# Altium footprint library IMR_Lib.PcbLib: 58 footprints (part 2 of 4)
Each footprint in its own frame and in the unit in brackets; x right, y up, seen from the top. Pads: shape width x height; smd on the part's side, far side on the other; paste and mask are expansions set on the pad; w line width, h text height; cw(c..) or ccw(c..) is an arc to the next point about the centre after c.
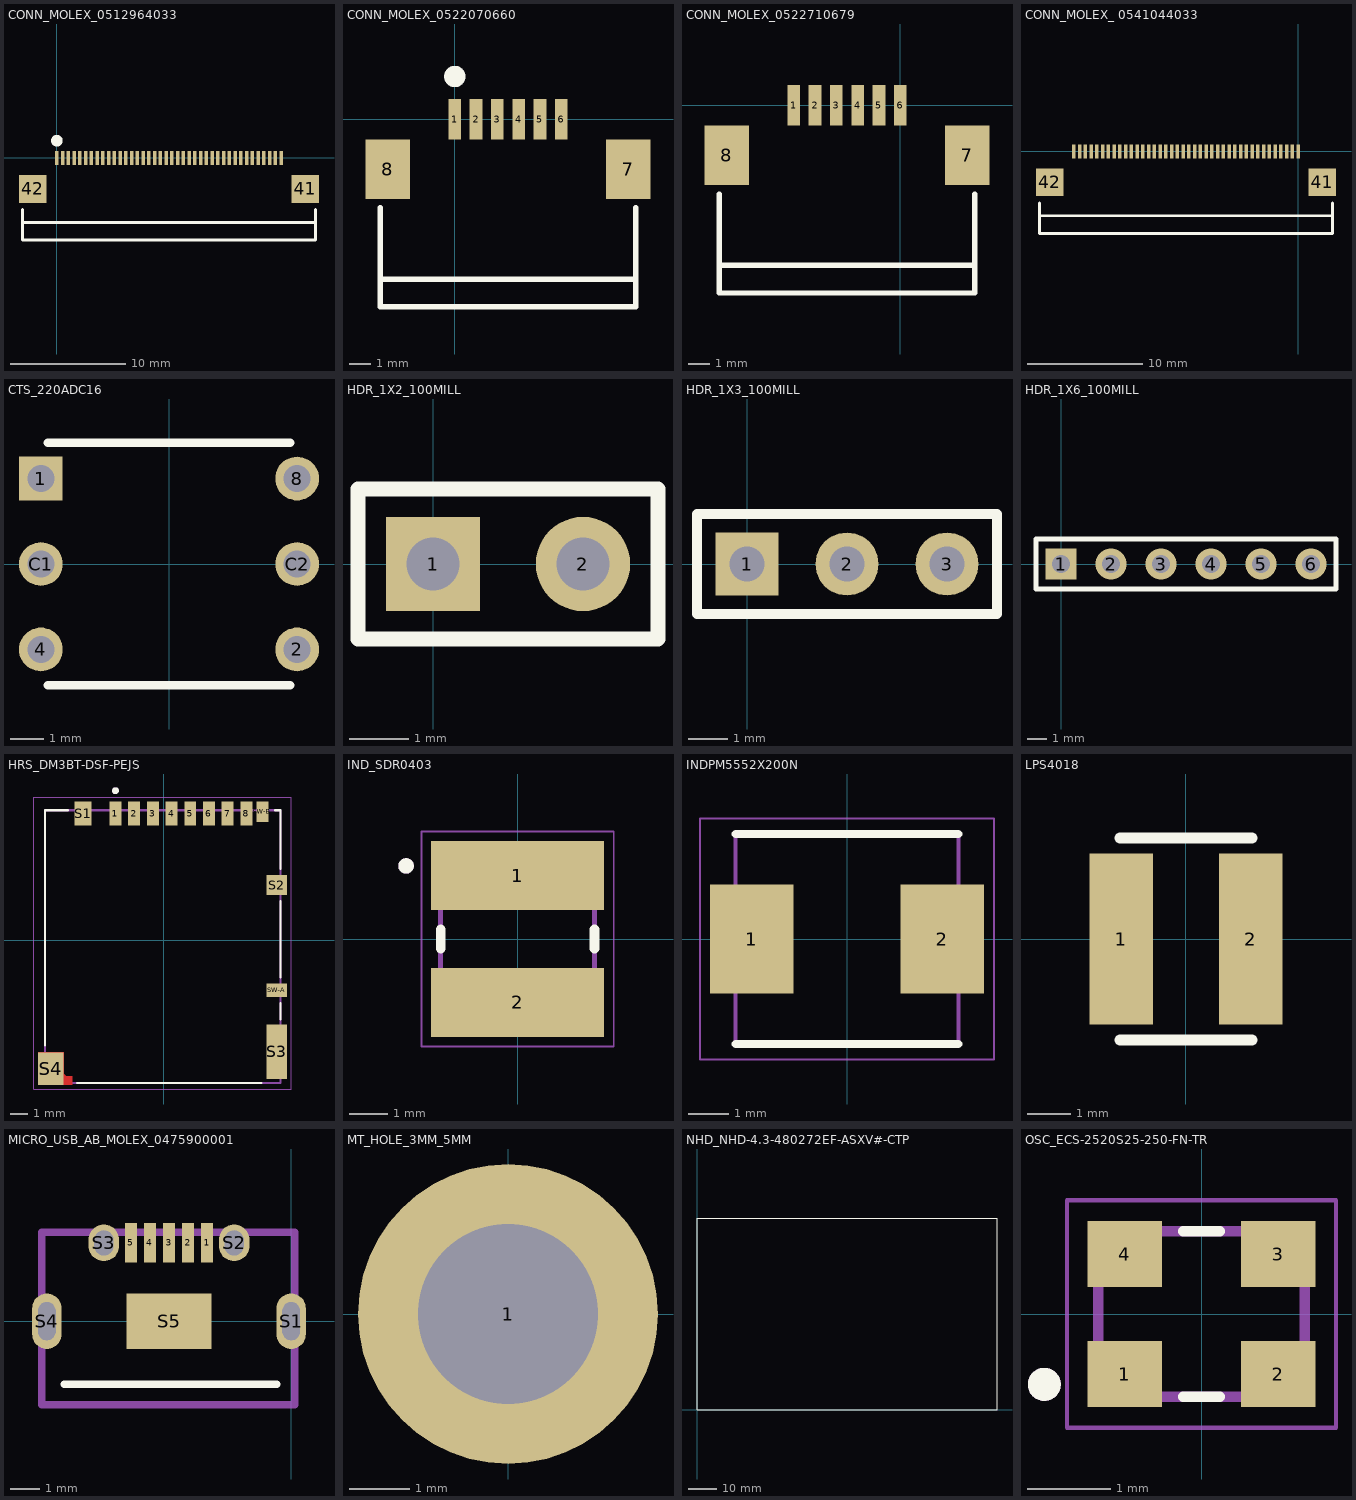
[diagram p1: the footprints below, top view; thin cyan lines are the x and y axes]

## CONN_MOLEX_0512964033 [mm] "MOLEX 0512964033 RGB888 NEW HAVEN CONNECTOR"
height 2
pads (42):
  rect 0.3x1.2 smd: 1(0,0) 2(0.5,0) 3(1,0) 4(1.5,0) 5(2,0) 6(2.5,0) 7(3,0) 8(3.5,0) 9(4,0) 10(4.5,0) 11(5,0) 12(5.5,0) 13(6,0) 14(6.5,0) 15(7,0) 16(7.5,0) 17(8,0) 18(8.5,0) 19(9,0) 20(9.5,0) 21(10,0) 22(10.5,0) 23(11,0) 24(11.5,0) 25(12,0) 26(12.5,0) 27(13,0) 28(13.5,0) 29(14,0) 30(14.5,0) 31(15,0) 32(15.5,0) 33(16,0) 34(16.5,0) 35(17,0) 36(17.5,0) 37(18,0) 38(18.5,0) 39(19,0) 40(19.5,0)
  rect 2.4x2.4 smd: 41(21.6,-2.7) 42(-2.1,-2.7)
Top Overlay:
  circle w0.508: c0,1.5 r0.25
  lines w0.254: -3,-5.6 22.5,-5.6 ; -3,-4.5 -3,-7.15 22.5,-7.15 22.5,-4.5
3D body "CONN_MOLEX_512964033.stp": height 1.35, standoff 0.05, extent -2.1,-4.3 21.6,0

## CONN_MOLEX_0522070660 [mm] "MOLEX 0522070660 NEW HAVEN TOUCH"
height 3
pads (8):
  rect 0.6x1.9 smd: 1(0,0) 2(1,0) 3(2,0) 4(3,0) 5(4,0) 6(5,0)
  rect 2.1x2.8 smd: 7(8.15,-2.35) 8(-3.15,-2.35)
Top Overlay:
  circle w0.508: c0,2 r0.25
  lines w0.254: -3.5,-7.525 8.5,-7.525 ; -3.5,-4.175 -3.5,-8.825 8.5,-8.825 8.5,-4.175
3D body "CONN_MOLEX_522070660.stp": height 2.75, standoff 0.05, extent -3.65,-7.55 8.65,0.05

## CONN_MOLEX_0522710679 [mm] "MOLEX 0522710679 NEW HAVEN TOUCH"
height 3
pads (8):
  rect 0.6x1.9 smd: 1(-5,0) 2(-4,0) 3(-3,0) 4(-2,0) 5(-1,0) 6(0,0)
  rect 2.1x2.8 smd: 7(3.15,-2.35) 8(-8.15,-2.35)
Top Overlay:
  lines w0.254: -8.5,-7.525 3.5,-7.525 ; -8.5,-4.175 -8.5,-8.825 3.5,-8.825 3.5,-4.175
3D body "CONN_MOLEX_522710679.stp": height 3.05, standoff 0.05, extent -9,-7.1 4,0.3

## CONN_MOLEX_ 0541044033 [mm] "MOLEX 0541044033 RGB888 NEW HAVEN CONNECTOR"
height 2
pads (42):
  rect 0.3x1.2 smd: 1(0,0) 2(-0.5,0) 3(-1,0) 4(-1.5,0) 5(-2,0) 6(-2.5,0) 7(-3,0) 8(-3.5,0) 9(-4,0) 10(-4.5,0) 11(-5,0) 12(-5.5,0) 13(-6,0) 14(-6.5,0) 15(-7,0) 16(-7.5,0) 17(-8,0) 18(-8.5,0) 19(-9,0) 20(-9.5,0) 21(-10,0) 22(-10.5,0) 23(-11,0) 24(-11.5,0) 25(-12,0) 26(-12.5,0) 27(-13,0) 28(-13.5,0) 29(-14,0) 30(-14.5,0) 31(-15,0) 32(-15.5,0) 33(-16,0) 34(-16.5,0) 35(-17,0) 36(-17.5,0) 37(-18,0) 38(-18.5,0) 39(-19,0) 40(-19.5,0)
  rect 2.4x2.4 smd: 41(2.1,-2.7) 42(-21.6,-2.7)
Top Overlay:
  lines w0.254: -22.5,-5.6 3,-5.6 ; -22.5,-4.5 -22.5,-7.15 3,-7.15 3,-4.5
3D body "CONN_MOLEX_541044033.stp": height 2.1, standoff 0.05, extent -22.55,-5.5 2.95,0.1

## CTS_220ADC16 [mm] "HEX ROTARY SWITCH"
height 8.15
pads (6):
  rect 1.3x1.3 hole 0.8: 1(-3.81,2.54)
  round 1.3 hole 0.8: 2(3.81,-2.54) 4(-3.81,-2.54) 8(3.81,2.54) C1(-3.81,0) C2(3.81,0)
Top Overlay:
  lines w0.254: -3.6,-3.6 3.6,-3.6 ; -3.6,3.6 3.6,3.6
3D body "CTS_220ADC16.STEP": height 8.1, standoff -3.5, extent -3.935,-3.6 3.935,3.6

## HDR_1X2_100MILL [mm] "SINGLE ROW 2 PIN HDR 2.54MM"
height 10.16
pads (2):
  rect 1.6x1.6 hole 0.9: 1(0,0)
  round 1.6 hole 0.9: 2(2.54,0)
Top Overlay:
  lines w0.254: -1.27,-1.27 -1.27,1.27 3.81,1.27 3.81,-1.27 -1.27,-1.27
3D body "CONN_HDR_1X2_100MIL.stp": height 8.57, standoff -2.97, extent -1.24,-1.27 3.84,1.27

## HDR_1X3_100MILL [mm] "SINGLE ROW 3 PIN HDR 2.54MM"
height 10.16
pads (3):
  rect 1.6x1.6 hole 0.9: 1(0,0)
  round 1.6 hole 0.9: 2(2.54,0) 3(5.08,0)
Top Overlay:
  lines w0.254: -1.27,-1.27 -1.27,1.27 6.35,1.27 6.35,-1.27 -1.27,-1.27
3D body "CONN_HDR_1X3_100MIL.stp": height 8.57, standoff -2.97, extent -1.27,-1.27 6.35,1.27

## HDR_1X6_100MILL [mm] "SINGLE ROW 6 PIN HDR 2.54MM"
pads (6):
  rect 1.6x1.6 hole 0.9: 1(0,0)
  round 1.6 hole 0.9: 2(2.54,0) 3(5.08,0) 4(7.62,0) 5(10.16,0) 6(12.7,0)
Top Overlay:
  lines w0.254: -1.27,-1.27 -1.27,1.27 13.97,1.27 13.97,-1.27 -1.27,-1.27
3D body "CONN_HDR_1X6_100MIL.stp": height 8.57, standoff -2.97, extent -1.32,-1.17 13.92,1.37

## HRS_DM3BT-DSF-PEJS [mm] "HIROSE_DM3BT-DSF-PEJS"
height 3
pads (14):
  rect 0.7x1.4 smd: 1(-2.85,7.45) 2(-1.75,7.45) 3(-0.65,7.45) 4(0.45,7.45) 5(1.55,7.45) 6(2.65,7.45) 7(3.75,7.45) 8(4.85,7.45)
  rect 1x1.4 smd: S1(-4.75,7.45)
  rect 1.2x1.2 smd: S2(6.65,3.25)
  rect 1.2x3.2 smd: S3(6.65,-6.55)
  rect 1.5x1.9 smd paste-2 mask+0: S4(-6.65,-7.55)
  rect 1.2x0.8 smd: SW-A(6.65,-2.95)
  rect 0.7x1.2 smd: SW-B(5.8,7.55)
Top Layer:
  region: -5.9,-7.85 -5.75,-8 -5.4,-8 -5.4,-8.5 -7.4,-8.5 -7.4,-6.6 -5.9,-6.6
Top Overlay:
  circle w0.2: c-2.85,8.8 r0.1
  lines w0.127: -7,-6.2 -7,7.65 -5.65,7.65 ; -5.1,-8.4 5.75,-8.4 ; 6.55,7.65 6.85,7.65 6.85,4.2 ; 6.85,-4.65 6.85,-3.7 ; 6.85,-2.2 6.85,2.3
Top Paste:
  region: -5.9,-7.85 -5.75,-8 -5.4,-8 -5.4,-8.5 -7.4,-8.5 -7.4,-6.6 -5.9,-6.6
Top Solder:
  region: -5.8,-7.75 -5.65,-7.9 -5.3,-7.9 -5.3,-8.6 -7.5,-8.6 -7.5,-6.5 -5.8,-6.5
Mechanical 13:
  circle w0.2: c-2.85,8.8 r0.1
  lines w0.127: -7,-8.4 6.85,-8.4 6.85,7.65 -7,7.65 -7,-8.4
Mechanical 15:
  lines w0.05: -7.65,-8.75 7.5,-8.75 7.5,8.4 -7.65,8.4 -7.65,-8.75
3D body "DM3BT-DSF-PEJS_Hab.step": height 1.85, standoff 0.02, extent -7,-9.875 6.85,7.675

## IND_SDR0403 [mm] "INDUCTOR BOURNS SDR0403 SERIES"
height 3.5
pads (2):
  rect 4.5x1.8 smd: 1(0,1.65) 2(0,-1.65)
Top Overlay:
  circle w0.2: c-2.9,1.9 r0.1
  lines w0.254: -2,-0.25 -2,0.25 ; 2,-0.25 2,0.25
Mechanical 13:
  circle w0.2: c-2.9,1.9 r0.1
  lines w0.127: -2,-0.75 ccw(c0,-0.361) 2,-0.75 2,0.75 ccw(c0,0.361) -2,0.75 -2,-0.75
Mechanical 15:
  lines w0.05: -2.5,-2.8 2.5,-2.8 2.5,2.8 -2.5,2.8 -2.5,-2.8
3D body "IND_SDR0403.step": height 3.25, standoff 0, extent -2.25,-2.201 2.25,2.201

## INDPM5552X200N [mm] "VISHAY IHLP-2020BZ-01"
height 2
pads (2):
  rect 2.05x2.7 smd: 1(-2.35,0) 2(2.35,0)
Top Overlay:
  lines w0.2: -2.745,-2.59 2.745,-2.59 ; -2.745,2.59 2.745,2.59
Mechanical 13:
  lines w0.05: -3.625,-2.967 -3.625,2.967 3.625,2.967 3.625,-2.967 -3.625,-2.967
  lines w0.1: -2.745,-2.59 -2.745,2.59 2.745,2.59 2.745,-2.59 -2.745,-2.59
3D body "VISHAY_IHLP-2020BZ-01.stp": height 2.05, standoff 0.13, extent -2.725,-2.546 2.725,2.6

## LPS4018 [mm] "COIL CRAFT LPS4018 INDUCTOR SERIES"
height 1.8
pads (2):
  rect 1.45x3.89 smd: 1(-1.475,0) 2(1.475,0)
Top Overlay:
  lines w0.254: -1.5,-2.3 1.5,-2.3 ; -1.5,2.3 1.5,2.3
3D body "COILCRAFT_LPS4018.step": height 1.8, standoff 0, extent -1.99,-1.99 1.99,1.99

## MICRO_USB_AB_MOLEX_0475900001 [mm] "MICRO USB AB MOLEX 0475900001"
height 0.6
pads (10):
  rect 0.4x1.35 smd: 1(-2.875,2.675) 2(-3.525,2.675) 3(-4.175,2.675) 4(-4.825,2.675) 5(-5.475,2.675)
  oval 1x1.9 hole 0.6 slot 1.3 at 90 deg: S1(0,0) S4(-8.35,0)
  oval 1.05x1.25 hole 0.65 slot 0.85 at 90 deg: S2(-1.95,2.675) S3(-6.4,2.675)
  rect 2.9x1.9 smd: S5(-4.175,0)
Top Overlay:
  lines w0.254: -7.75,-2.15 -0.5,-2.15
Mechanical 15:
  lines w0.254: -8.525,-2.859 -8.525,3.034 0.125,3.034 0.125,-2.859 -8.525,-2.859
3D body "47589-0001.stp": height 2.76, standoff -0.55, extent -8.5,-2.947 0.15,2.947

## MT_HOLE_3MM_5MM [mm] "3MM ID / 5MM OD"
pads (1):
  round 5 hole 3: 1(0,0)

## NHD_NHD-4.3-480272EF-ASXV#-CTP [mm] "TFT LCD 480 X 272 RGB888"
height 4.65
Top Overlay:
  lines w0.254: 0,0 0,67.25 105.5,67.25 105.5,0 0,0
3D body: height 7.66, standoff 7.65, extent 0,9 4.75,62.5
3D body: height 7.66, standoff 7.65, extent 0,0 105.5,9
3D body: height 7.66, standoff 7.65, extent 100.75,9 105.5,62.5
3D body: height 7.66, standoff 7.65, extent 0,62.5 105.5,67.25
3D body: height 7.65, standoff 3, extent 100.75,9 105.5,62.5
3D body: height 7.65, standoff 3, extent 0,9 4.75,62.5
3D body: height 7.65, standoff 3, extent 0,0 105.5,9
3D body: height 7.65, standoff 3, extent 0,62.5 105.5,67.25
3D body: height 7.66, standoff 7.65, extent 4.75,9 100.75,62.5

## OSC_ECS-2520S25-250-FN-TR [mm]
pads (4):
  rect 0.9x0.8 smd: 1(-0.925,-0.725) 2(0.925,-0.725) 3(0.925,0.725) 4(-0.925,0.725)
Top Overlay:
  circle w0.2: c-1.9,-0.85 r0.1
  lines w0.127: -0.221,-1 0.221,-1 ; -0.221,1 0.221,1
Mechanical 13:
  circle w0.2: c-1.9,-0.85 r0.1
  lines w0.127: -1.25,-1 -1.25,1 1.25,1 1.25,-1 -1.25,-1
Mechanical 15:
  lines w0.05: -1.625,-1.375 -1.625,1.375 1.625,1.375 1.625,-1.375 -1.625,-1.375
3D body "ECX-32.STEP": height 0.82, standoff 0, extent -1.6,-1.25 1.6,1.25